# Altium schematic symbol library AD_Lib.SchLib: 1239 symbols (part 1 of 9) (continued)
## C1210_1uF/50V
designator C?, comment 1uF,50V
ÌùÆ¬µçÈÝ; Manufacturer: Murata; pro-environment: RoHS; Quality: -55~125¡æ; SN: 03.4.37.18.19010501S; other: 1uF,50V,10%; OPN: GCM32ER71H105KA37L; PadsNum: 2; Category: µçÈÝ; Part: GCM32ER71H105KA37L; Value: 1uF,50V; QTY: 1000; Price: 2.6091; OPN_JLC: OPN_JLC; SN_JLC: SN_JLC; Price_JLC: 0
footprint C1210 (Chip Capacitor; Body 1.2x 1.0 mm (LxW typ))
pins: 1, 2

## C1210_2.2nF/2kV@3
designator C?, comment 2.2nF,2kV
ÌùÆ¬µçÈÝ; Manufacturer: Yageo; pro-environment: RoHS; Quality: -55~125¡æ; other: 2.2nF,2kV,10%; OPN: CC1210KKX7RDBB222; PadsNum: 2; SN: SN; Category: µçÈÝ; Part: CC1210KKX7RDBB222; Value: 2.2nF,2kV; QTY: 2000; Price: 2.0592; OPN_JLC: OPN_JLC; SN_JLC: SN_JLC; Price_JLC: 0
footprint C1210 (Chip Capacitor; Body 1.2x 1.0 mm (LxW typ))
pins: 1, 2

## C1210_2.2uF/100V
designator C?, comment 2.2uF,100V
ÌùÆ¬µçÈÝ; Manufacturer: Murata; pro-environment: RoHS; Quality: -55~125¡æ; other: 2.2uF,100V,10%; OPN: GCM32DR72A225KA64L; PadsNum: 2; SN: SN; Category: µçÈÝ; Part: GCM32DR72A225KA64L; Value: 2.2uF,100V; QTY: 1000; Price: 2.5155; OPN_JLC: OPN_JLC; SN_JLC: SN_JLC; Price_JLC: 0
footprint C1210 (Chip Capacitor; Body 1.2x 1.0 mm (LxW typ))
pins: 1, 2

## C1210_4.7uF/50V
designator C?, comment 4.7uF,50V
ÌùÆ¬µçÈÝ; Manufacturer: Murata; pro-environment: RoHS; Quality: -55~125¡æ; SN: 03.4.37.18.19047501S; other: 4.7uF,50V,10%; OPN: GRM32ER71H475KA88L; PadsNum: 2; Category: µçÈÝ; Part: GRM32ER71H475KA88L; Value: 4.7uF,50V; QTY: 1000; Price: 2.0592; OPN_JLC: OPN_JLC; SN_JLC: SN_JLC; Price_JLC: 0
footprint C1210 (Chip Capacitor; Body 1.2x 1.0 mm (LxW typ))
pins: 1, 2

## C1210_10uF/50V
designator C?, comment 10uF,50V
ÌùÆ¬µçÈÝ; Manufacturer: Murata; pro-environment: RoHS; Quality: -55~125¡æ; SN: 03.4.37.18.19010605S; other: 10uF,50V,10%; OPN: GRM32ER71H106KA12L; PadsNum: 2; Category: µçÈÝ; Part: GRM32ER71H106KA12L; Value: 10uF,50V; QTY: 1000; Price: 2.1645; OPN_JLC: OPN_JLC; SN_JLC: SN_JLC; Price_JLC: 0
footprint C1210 (Chip Capacitor; Body 1.2x 1.0 mm (LxW typ))
pins: 1, 2

## C1210_10uF/50V@3
designator C?, comment 10uF,50V
ÌùÆ¬µçÈÝ; Manufacturer: Yageo; pro-environment: RoHS; Quality: -55~85¡æ; SN: 03.4.37.18.19010603S; other: 10uF,50V,20%; OPN: CC1210MKX5R9BB106; PadsNum: 2; Category: µçÈÝ; Part: CC1210MKX5R9BB106; Value: 10uF,50V; QTY: 500; Price: ?; OPN_JLC: OPN_JLC; SN_JLC: SN_JLC; Price_JLC: 0
footprint C1210 (Chip Capacitor; Body 1.2x 1.0 mm (LxW typ))
pins: 1, 2

## C1210_22uF/16V@2
designator C?, comment 22uF,16V
ÌùÆ¬µçÈÝ; Manufacturer: Panasonic; pro-environment: RoHS; Quality: -55~125¡æ; other: 22uF,16V,10%; OPN: Undefined; PadsNum: 2; SN: SN; Category: µçÈÝ; Value: 22uF,16V; Price: ?; OPN_JLC: OPN_JLC; SN_JLC: SN_JLC; Price_JLC: 0
footprint C1210 (Chip Capacitor; Body 1.2x 1.0 mm (LxW typ))
pins: 1, 2

## C1210_22uF/16V@3
designator C?, comment 22uF,25V
ÌùÆ¬µçÈÝ; Manufacturer: Yageo; pro-environment: RoHS; Quality: -55~85¡æ; SN: 03.4.37.18.19022601S; other: 22uF,25V,20%; OPN: CC1210MKX5R8BB226; PadsNum: 2; Category: µçÈÝ; Part: CC1210MKX5R8BB226; Value: 22uF,25V; Price: ?; OPN_JLC: OPN_JLC; SN_JLC: SN_JLC; Price_JLC: 0
footprint C1210 (Chip Capacitor; Body 1.2x 1.0 mm (LxW typ))
pins: 1, 2

## C1210_22uF/25V
designator C?, comment 22uF,25V
ÌùÆ¬µçÈÝ; Manufacturer: Murata; pro-environment: RoHS; Quality: -55~125¡æ; SN: 03.4.37.18.19022603S; other: 22uF,25V,10%; OPN: GRM32ER71E226KE15L; PadsNum: 2; Category: µçÈÝ; Part: GRM32ER71E226KE15L; Value: 22uF,25V; QTY: 1000; Price: 1.7901; OPN_JLC: OPN_JLC; SN_JLC: SN_JLC; Price_JLC: 0
footprint C1210 (Chip Capacitor; Body 1.2x 1.0 mm (LxW typ))
pins: 1, 2

## C1210_47nF/630V
designator C?, comment 47nF,630V
ÌùÆ¬µçÈÝ; Manufacturer: Murata; pro-environment: RoHS; Quality: -55~125¡æ; SN: 03.4.37.18.19047301S; other: 47nF,630V,10%; OPN: GRM32DR72J473KW01L; PadsNum: 2; Category: µçÈÝ; Part: GRM32DR72J473KW01L; Value: 47nF,630V; QTY: 1000; Price: 1.638; OPN_JLC: OPN_JLC; SN_JLC: SN_JLC; Price_JLC: 0
footprint C1210 (Chip Capacitor; Body 1.2x 1.0 mm (LxW typ))
pins: 1, 2

## C1210_47uF/16V
designator C?, comment 47uF,16V
MLCC C1210; Manufacturer: Yageo; pro-environment: RoHS; Quality: -55~85¡æ; other: 47uF,16V,20%; PadsNum: 2; Category: µçÈÝ; Value: 47uF,16V; Price: ?; OPN_JLC: OPN_JLC; SN_JLC: SN_JLC; Price_JLC: 0
footprint C1210 (Chip Capacitor; Body 1.2x 1.0 mm (LxW typ))
pins: 1, 2

## C1210_100uF/10V
designator C?, comment 100uF,10V
ÌùÆ¬µçÈÝ; Manufacturer: Murata; pro-environment: RoHS; Quality: -55~85¡æ; SN: 03.4.37.18.19010701S; other: 100uF,10V,20%; OPN: GRM32ER61A107ME20L; PadsNum: 2; Category: µçÈÝ; Part: GRM32ER61A107ME20L; Value: 100uF,10V; Price: ?; OPN_JLC: OPN_JLC; SN_JLC: SN_JLC; Price_JLC: 0
footprint C1210 (Chip Capacitor; Body 1.2x 1.0 mm (LxW typ))
pins: 1, 2

## C1210_100uF/16V@2
designator C?, comment 100uF,10V
ÌùÆ¬µçÈÝ; Manufacturer: Panasonic; pro-environment: RoHS; Quality: -55~125¡æ; other: 100uF,10V,20%; OPN: Undefined; PadsNum: 2; SN: SN; Category: µçÈÝ; Value: 100uF,10V; Price: ?; OPN_JLC: OPN_JLC; SN_JLC: SN_JLC; Price_JLC: 0
footprint C1210 (Chip Capacitor; Body 1.2x 1.0 mm (LxW typ))
pins: 1, 2

## C1812_0.1uF/630V
designator C?, comment 0.1uF,630V
ÌùÆ¬µçÈÝ; Manufacturer: Murata; pro-environment: RoHS; Quality: -55~125¡æ; SN: 03.4.37.18.20010401S; other: 0.1uF,630V,10%,X7R; OPN: GRM43DR72J104KW01L; PadsNum: 2; Category: µçÈÝ; Part: GRM43DR72J104KW01L; Value: 0.1uF,630V; QTY: 1000; Price: 1.5678; OPN_JLC: OPN_JLC; SN_JLC: SN_JLC; Price_JLC: 0
footprint C1812 (¹«ÖÆ4832£»Ó¢ÖÆ1812£»)
pins: 1, 2

## C1812_1nF/2kV
designator C?, comment 1nF,2kV
ÌùÆ¬µçÈÝ; Manufacturer: Murata; pro-environment: RoHS; Quality: -55~125¡æ; SN: 03.4.37.18.20010203S; other: 1nF,2kV,10%; OPN: GR443QR73D102KW01K; PadsNum: 2; Category: µçÈÝ; Part: GR443QR73D102KW01K; Value: 1nF,2kV; QTY: 4000; Price: 1.2519; OPN_JLC: OPN_JLC; SN_JLC: SN_JLC; Price_JLC: 0
footprint C1812 (¹«ÖÆ4832£»Ó¢ÖÆ1812£»)
pins: 1, 2

## C1812_1nF/2kV@3
designator C?, comment 1nF,250kV
ÌùÆ¬µçÈÝ; Manufacturer: Yageo; pro-environment: RoHS; Quality: -55~125¡æ; SN: 03.4.37.18.20010202S; other: 1nF,250V,10%; OPN: SC1812KKX7RWBB102; PadsNum: 2; Category: µçÈÝ; Part: SC1812KKX7RWBB102; Value: 1nF,250kV; QTY: 1000; Price: 2.0358; OPN_JLC: OPN_JLC; SN_JLC: SN_JLC; Price_JLC: 0
footprint C1812 (Footprint not found)
pins: 1, 2

## C1812_1nF/250V@3
designator C?, comment 1nF,250V
ÌùÆ¬µçÈÝ; Manufacturer: Yageo; pro-environment: RoHS; Quality: -55~125¡æ; SN: 03.4.37.18.20010202S; other: 1nF,250V,10%; OPN: SC1812KKX7RWBB102; PadsNum: 2; Category: µçÈÝ; Part: SC1812KKX7RWBB102; Value: 1nF,250V; QTY: 1000; Price: ?; OPN_JLC: OPN_JLC; SN_JLC: SN_JLC; Price_JLC: 0
footprint C1812 (¹«ÖÆ4832£»Ó¢ÖÆ1812£»)
pins: 1, 2

## C2220_2.2uF/250V
designator C?, comment 2.2uF,250V
ÌùÆ¬µçÈÝ; Manufacturer: TDK; pro-environment: RoHS; Quality: -55~125¡æ; other: 2.2uF,250V,20%; OPN: C5750X7T2E225M250KE; PadsNum: 2; SN: SN; Category: µçÈÝ; Part: C5750X7T2E225M250KE; Value: 2.2uF,250V; QTY: 500; Price: 13.0338; OPN_JLC: OPN_JLC; SN_JLC: SN_JLC; Price_JLC: 0
footprint C2220 (Footprint not found)
pins: 1, 2

## C2220_10uF/100V
designator C?, comment 10uF,100V
ÌùÆ¬µçÈÝ; Manufacturer: TDK; pro-environment: RoHS; Quality: -55~125¡æ; other: 10uF,100V,20%; OPN: CGA9N3X7S2A106M230KB; PadsNum: 2; SN: SN; Category: µçÈÝ; Part: CGA9N3X7S2A106M230KB; Value: 10uF,100V; QTY: 500; Price: 8.4825; OPN_JLC: OPN_JLC; SN_JLC: SN_JLC; Price_JLC: 0
footprint C2220 (Footprint not found)
pins: 1, 2

## C_0.1uF/50V
designator C?, comment 0.1uF,50V
ÌùÆ¬PPSµçÈÝ; Manufacturer: Murata; pro-environment: RoHS; Quality: -55~125¡æ; SN: 03.4.37.12.99010401S; other: 0.1uF,50V,10%; OPN: ECHU1H104Gx9; PadsNum: 2; Category: µçÈÝ; Part: ECHU1H104Gx9; Value: 0.1uF,50V; QTY: 3000; Price: ?; OPN_JLC: OPN_JLC; SN_JLC: SN_JLC; Price_JLC: 0
footprint CC4532-1812-
pins: 1, 2

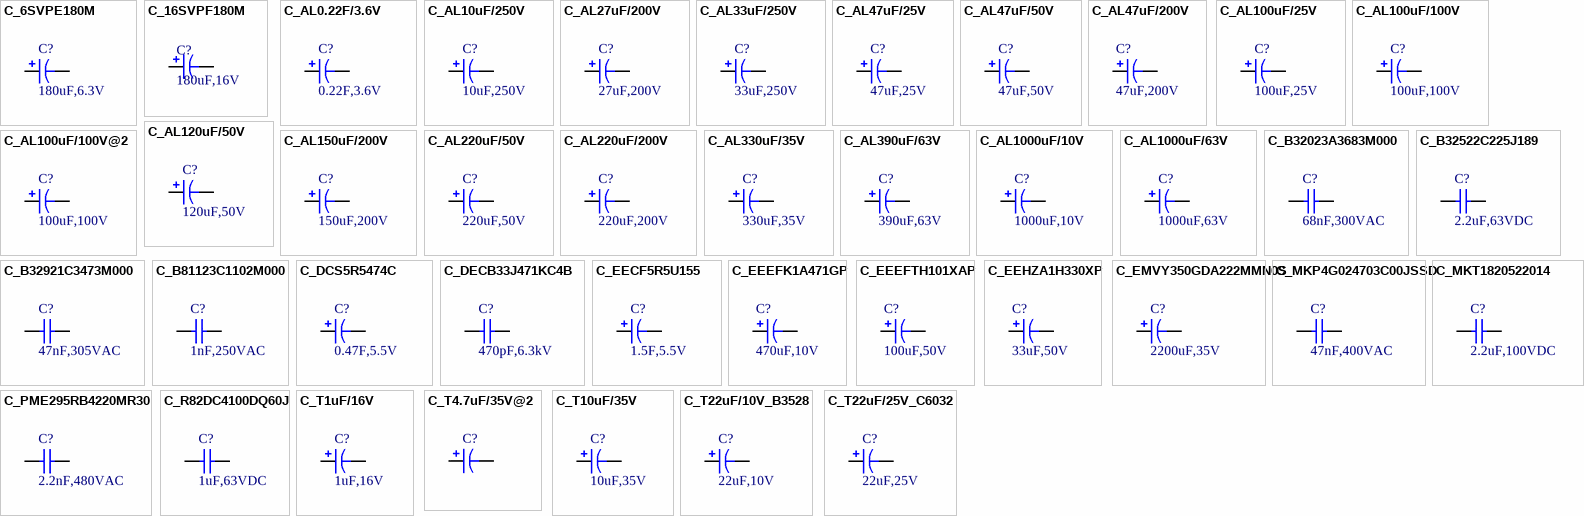
[diagram p3: symbols C_6SVPE180M to C_T22uF/25V_C6032]

## C_6SVPE180M
designator C?, comment 180uF,6.3V
¹ÌÌ¬µçÈÝ; 180uF/6.3V; 20%; Manufacturer: Panasonic; pro-environment: RoHS; Quality: -55~105¡ãC; other: 180uF,6.3V,20%; OPN: 6SVPE180M; PadsNum: 2; SN: SN; Category: µçÈÝ; Part: 6SVPE180M; Value: 180uF,6.3V; QTY: 1500; Price: 3.4515; OPN_JLC: OPN_JLC; SN_JLC: C178382; Price_JLC: 2.66
footprint C_SMD5x5.9 (PanasonicÖ®ÂÁÓÐ»ú¾ÛºÏÎïµçÈÝÆ÷)
pins: 1, 2

## C_16SVPF180M
designator C?, comment 180uF,16V
¹ÌÌ¬µçÈÝ; 180uF/16V; 20%; Manufacturer: Panasonic; OPN: 16SVPF180M; other: 180uF,16V,20%; pro-environment: RoHS; Quality: -55~105¡ãC; PadsNum: 2; Category: µçÈÝ; Part: 16SVPF180M; Price: 3.3228; QTY: 1000; SN: SN; Value: 180uF,16V; OPN_JLC: 16SVPF180M; SN_JLC: C136277; Price_JLC: 2.95
footprint C_SMD6.3x5.9 (PanasonicÖ®SVPEÏµÁÐ¹ÌÌ¬µçÈÝ)
pins: 1, 2

## C_AL0.22F/3.6V
designator C?, comment 0.22F,3.6V
ÂÁµç½âµçÈÝ; 10¡Á11.5¡Á6; Manufacturer: Panasonic; pro-environment: RoHS; Quality: -55~125¡æ; other: 0.22F,3.6V,20%,1000h,25mm; OPN: EEC-RG0V224H; PadsNum: 2; SN: SN; Category: µçÈÝ; Part: EEC-RG0V224H; Value: 0.22F,3.6V; QTY: 50; Price: 8.42; OPN_JLC: EECRG0V224H; SN_JLC: C236295; Price_JLC: 8.42
footprint C_EECRG0V224 (Footprint not found)
pins: 1, 2

## C_AL10uF/250V
designator C?, comment 10uF,250V
ÂÁµç½âµçÈÝ;5x10; Manufacturer: Nichicon; pro-environment: RoHS; Quality: -55~125¡æ; SN: 03.4.37.12.99010002S; other: 10uF,250V,20%,8000h,20mm; OPN: UCS2E100MPD; PadsNum: 2; Category: µçÈÝ; Part: UCS2E100MPD; Value: 10uF,250V; QTY: 200; Price: 2.2698; OPN_JLC: OPN_JLC; SN_JLC: SN_JLC; Price_JLC: 0
footprint C_RD5x10 (Ö±²åµç½âµçÈÝ)
pins: 1, 2

## C_AL27uF/200V
designator C?, comment 27uF,200V
ÂÁµç½âµçÈÝ;5x10; Manufacturer: Nichicon; pro-environment: RoHS; Quality: -55~125¡æ; SN: 03.4.37.12.99027001S; other: 150uF,200V,20%,1000h; OPN: ULD2D270MPD1TD; PadsNum: 2; Category: µçÈÝ; Part: ULD2D270MPD1TD; Value: 27uF,200V; QTY: 500; Price: 3.4398; OPN_JLC: OPN_JLC; SN_JLC: SN_JLC; Price_JLC: 0
footprint C_RD5x10 (Ö±²åµç½âµçÈÝ)
pins: 1, 2

## C_AL33uF/250V
designator C?, comment 33uF,250V
ÂÁµç½âµçÈÝ;5x12.5; Manufacturer: Nichicon; pro-environment: RoHS; Quality: -55~125¡æ; SN: 03.4.37.12.99033002S; other: 33uF,250V,20%,8000h,20mm; OPN: UCS2E330MHD1TO; PadsNum: 2; Category: µçÈÝ; Part: UCS2E330MHD1TO; Value: 33uF,250V; QTY: 500; Price: 2.691; OPN_JLC: OPN_JLC; SN_JLC: SN_JLC; Price_JLC: 0
footprint C_RD5x12.5 (Footprint not found)
pins: 1, 2

## C_AL47uF/25V
designator C?, comment 47uF,25V
ÂÁµç½âµçÈÝ;2x5; Manufacturer: Nichicon; pro-environment: RoHS; Quality: -55~105¡æ; other: 47uF,25V,20%,2000h; OPN: UPW1E470MDD; PadsNum: 2; SN: SN; Category: µçÈÝ; Part: UPW1E470MDD; Value: 47uF,25V; QTY: 200; Price: 0.55809; OPN_JLC: OPN_JLC; SN_JLC: SN_JLC; Price_JLC: 0
footprint C_RD2x5 (Ö±²åµç½âµçÈÝ)
pins: 1, 2

## C_AL47uF/50V
designator C?, comment 47uF,50V
ÂÁµç½âµçÈÝ;3.5x6.3; Manufacturer: Nichicon; pro-environment: RoHS; Quality: -55~105¡æ; SN: 03.4.37.12.99047001S; other: 47uF,50V,20%,5000h; OPN: UPV1H470MGD; PadsNum: 2; Category: µçÈÝ; Part: UPV1H470MGD; Value: 47uF,50V; QTY: 200; Price: 1.7199; OPN_JLC: OPN_JLC; SN_JLC: SN_JLC; Price_JLC: 0
footprint C_RD3.5x6.3 (Ö±²åµç½âµçÈÝ)
pins: 1, 2

## C_AL47uF/200V
designator C?, comment 47uF,200V
ÂÁµç½âµçÈÝ;5x12.5; Manufacturer: Nichicon; Quality: -40~105¡ãC; SN: 03.4.37.12.99047002S; other: 47uF,200V,20%; OPN: UPW2D470MHD; PadsNum: 2; Category: µçÈÝ; Part: UPW2D470MHD; Value: 47uF,200V; QTY: 1000; Price: ?; OPN_JLC: OPN_JLC; SN_JLC: SN_JLC; Price_JLC: 0
footprint C_RD5x12.5 (Ö±²åµç½âµçÈÝ)
pins: 1, 2

## C_AL100uF/25V
designator C?, comment 100uF,25V
ÂÁµç½âµçÈÝ; 2.5¡Á6.3¡Á11.0; Manufacturer: Nichicon; pro-environment: RoHS; Quality: -40~105¡æ; SN: 03.4.37.12.99010105S; other: 100uF,25V,20%,340mA,5000h; OPN: UHE1E101MED; PadsNum: 2; Category: µçÈÝ; Part: UHE1E101MED; Value: 100uF,25V; QTY: 200; Price: 0.74295; OPN_JLC: OPN_JLC; SN_JLC: SN_JLC; Price_JLC: 0
footprint C_RD2.5x6.3 (Footprint not found)
pins: 1, 2

## C_AL100uF/100V
designator C?, comment 100uF,100V
ÂÁµç½âµçÈÝ; 5.0¡Á10.0¡Á25.0; Manufacturer: Nichicon; pro-environment: RoHS; Quality: -40~105¡æ; SN: 03.4.37.12.99010106S; other: 100uF,100V,20%,595mA,7000h; OPN: UHE2A101MPD; PadsNum: 2; Category: µçÈÝ; Part: UHE2A101MPD; Value: 100uF,100V; QTY: 200; Price: 1.8486; OPN_JLC: OPN_JLC; SN_JLC: SN_JLC; Price_JLC: 0
footprint C_RD5x10 (Ö±²åµç½âµçÈÝ)
pins: 1, 2

## C_AL100uF/100V@2
designator C?, comment 100uF,100V
ÂÁµç½âµçÈÝ; 5.0¡Á12.5¡Á20.0; Manufacturer: Nichicon; pro-environment: RoHS; Quality: -40~105¡æ; SN: 03.4.37.12.99010107S; other: 100uF,100V,20%,595mA,7000h; OPN: UPW2A101MHD; PadsNum: 2; Category: µçÈÝ; Part: UPW2A101MHD; Value: 100uF,100V; QTY: 100; Price: 2.925; OPN_JLC: OPN_JLC; SN_JLC: SN_JLC; Price_JLC: 0
footprint C_RD5x12.5 (Ö±²åµç½âµçÈÝ)
pins: 1, 2

## C_AL120uF/50V
designator C?, comment 120uF,50V
ÂÁµç½âµçÈÝ;5x10; Manufacturer: Nichicon; pro-environment: RoHS; Quality: -55~105¡æ; SN: 03.4.37.12.99012101S; other: 120uF,50V,20%,8000h; OPN: UPW1H121MPD6; PadsNum: 2; Category: µçÈÝ; Part: UPW1H121MPD6; Value: 120uF,50V; QTY: 200; Price: -; OPN_JLC: OPN_JLC; SN_JLC: SN_JLC; Price_JLC: 0
footprint C_RD5x10 (Ö±²åµç½âµçÈÝ)
pins: 1, 2

## C_AL150uF/200V
designator C?, comment 150uF,200V
ÂÁµç½âµçÈÝ; 7.5x18; Manufacturer: Nichicon; pro-environment: RoHS; Quality: -55~125¡æ; SN: 03.4.37.12.99015101S; other: 150uF,200V,20%,1000h; OPN: URZ2D151MHD; PadsNum: 2; Category: µçÈÝ; Part: URZ2D151MHD; Value: 150uF,200V; QTY: 50; Price: 16.0173; OPN_JLC: OPN_JLC; SN_JLC: SN_JLC; Price_JLC: 0
footprint C_RD7.5x18 (Ö±²åµç½âµçÈÝ)
pins: 1, 2

## C_AL220uF/50V
designator C?, comment 220uF,50V
ÂÁµç½âµçÈÝ;5x10x13; Manufacturer: AISHI; pro-environment: RoHS; Quality: -40~105¡æ; other: 220uF,50V,20%,2000h; OPN: EWH1HM221G13OT; PadsNum: 0; SN: SN; Category: µçÈÝ; Part: EWH1HM221G13OT; Value: 220uF,50V; QTY: 250; Price: -; OPN_JLC: EWH1HM221G13OT; SN_JLC: C105324; Price_JLC: 0.398604
footprint C_RD5x10 (Ö±²åµç½âµçÈÝ)
pins: 1, 2

## C_AL220uF/200V
designator C?, comment 220uF,200V
ÂÁµç½âµçÈÝ; 7.5x18; Manufacturer: Nichicon; pro-environment: RoHS; Quality: -55~125¡æ; SN: 03.4.37.12.99022102S; other: 220uF,200V,20%,8000h; OPN: UCS2D221MHD1TN; PadsNum: 2; Category: µçÈÝ; Part: UCS2D221MHD1TN; Value: 220uF,200V; QTY: 50; Price: -; OPN_JLC: OPN_JLC; SN_JLC: SN_JLC; Price_JLC: 0
footprint C_RD7.5x18 (Ö±²åµç½âµçÈÝ)
pins: 1, 2

## C_AL330uF/35V
designator C?, comment 330uF,35V
ÂÁµç½âµçÈÝ;5x10; Manufacturer: Nichicon; pro-environment: RoHS; Quality: -55~105¡æ; SN: 03.4.37.12.99033101S; other: 330uF,35V,20%,5000h,1060mA; OPN: UPM1V331MPD; PadsNum: 2; Category: µçÈÝ; Part: UPM1V331MPD; Value: 330uF,35V; QTY: 200; Price: 1.8837; OPN_JLC: OPN_JLC; SN_JLC: SN_JLC; Price_JLC: 0
footprint C_RD5x10 (Ö±²åµç½âµçÈÝ)
pins: 1, 2

## C_AL390uF/63V
designator C?, comment 390uF,63V
ÂÁµç½âµçÈÝ; 5x10x12.5; Manufacturer: Nichicon; pro-environment: RoHS; Quality: -55~105¡æ; SN: 03.4.37.12.99039101S; other: 390uF,63V,20%,5000h,1720mA; OPN: UPW1J391MHD; PadsNum: 2; Category: µçÈÝ; Part: UPW1J391MHD; Value: 390uF,63V; QTY: 100; Price: 3.5685; OPN_JLC: OPN_JLC; SN_JLC: SN_JLC; Price_JLC: 0
footprint C_RD5x12.5 (Ö±²åµç½âµçÈÝ)
pins: 1, 2

## C_AL1000uF/10V
designator C?, comment 1000uF,10V
ÂÁµç½âµçÈÝ; 5x10; Manufacturer: Nichicon; pro-environment: RoHS; Quality: -55~125¡æ; SN: 03.4.37.12.99010202S; other: 1000uF,10V,20%,5000h,20mm; OPN: UPM1A102MPD; PadsNum: 2; Category: µçÈÝ; Part: UPM1A102MPD; Value: 1000uF,10V; QTY: 200; Price: 1.872; OPN_JLC: OPN_JLC; SN_JLC: SN_JLC; Price_JLC: 0
footprint C_RD5x10 (Ö±²åµç½âµçÈÝ)
pins: 1, 2

## C_AL1000uF/63V
designator C?, comment 1000uF,63V
ÂÁµç½âµçÈÝ; 7.5¡Á16¡Á25.0; Manufacturer: Nichicon; pro-environment: RoHS; Quality: -55~125¡æ; SN: 03.4.37.12.99010201S; other: 1000uF,63V,20%,1000h,25mm; OPN: UVZ1J102MHD; PadsNum: 2; Category: µçÈÝ; Part: UVZ1J102MHD; Value: 1000uF,63V; QTY: 50; Price: 6.4701; OPN_JLC: OPN_JLC; SN_JLC: SN_JLC; Price_JLC: 0
footprint C_RD7.5x16 (Ö±²åµç½âµçÈÝ)
pins: 1, 2

## C_B32023A3683M000
designator C?, comment 68nF,300VAC
X1Y2µçÈÝ,68nF/300VAC; Manufacturer: TDK; Part: B32023A3683M; pro-environment: RoHS; Quality: -40~110¡æ; SN: 03.4.37.17.99110201S; other: 68nF,300VAC,20%; OPN: B32023A3683M000; PadsNum: 2; Category: µçÈÝ; Value: 68nF,300VAC; QTY: 1000; Price: 1.6731; OPN_JLC: OPN_JLC; SN_JLC: SN_JLC; Price_JLC: 0
footprint B32023_7¡Á16¡Á26.5 (TDKÖ®X2µçÈÝ£¬Òý½Å¼ä¾à=22.5mm£¬³ß´ç = w ¡Á h ¡Á l)
pins: 1, 2

## C_B32522C225J189
designator C?, comment 2.2uF,63VDC
±¡Ä¤µçÈÝ,2.2uF/63VDC; Manufacturer: TDK; pro-environment: RoHS; Quality: -40~110¡æ; SN: 03.4.37.24.99022502S; other: 2.2uF,63VDC,5%; OPN: B32522C0225J189; PadsNum: 2; Category: µçÈÝ; Part: B32522C0225J189; Value: 2.2uF,63VDC; QTY: 5200; Price: 5.6628; OPN_JLC: OPN_JLC; SN_JLC: SN_JLC; Price_JLC: 0
footprint B32522_5¡Á10.5¡Á18 (Footprint not found)
pins: 1, 2

## C_B32921C3473M000
designator C?, comment 47nF,305VAC
X2µçÈÝ,47nF/305VAC; Manufacturer: TDK; pro-environment: RoHS; Quality: -40~110¡æ; SN: 03.4.37.17.99347301S; other: 47nF,305VAC,20%; OPN: B32921C3473M000; PadsNum: 2; Category: µçÈÝ; Part: B32921C3473M000; Value: 47nF,305VAC; QTY: 1000; Price: 1.06236; OPN_JLC: OPN_JLC; SN_JLC: SN_JLC; Price_JLC: 0
footprint B32921_5¡Á11¡Á13 (TDKÖ®X2µçÈÝ£¬Òý½Å¼ä¾à = 10mm£¬³ß´ç = w ¡Á h ¡Á l)
pins: 1, 2

## C_B81123C1102M000
designator C?, comment 1nF,250VAC
Y1µçÈÝ,1nF/250VAC; Manufacturer: TDK; pro-environment: RoHS; Quality: -40~110¡æ; SN: 03.4.37.17.99110201S; other: 1nF,500VAC,20%; OPN: B81123C1102M000; PadsNum: 2; Category: µçÈÝ; Part: B81123C1102M000; Value: 1nF,250VAC; QTY: 1000; Price: 1.6731; OPN_JLC: OPN_JLC; SN_JLC: SN_JLC; Price_JLC: 0
footprint B81123_5¡Á10.5¡Á18 (TDKÖ®Y1µçÈÝ£¬Òý½Å¼ä¾à = 15mm£¬³ß´ç = w ¡Á h ¡Á l)
pins: 1, 2

## C_DCS5R5474C
designator C?, comment 0.47F,5.5V
³¬¼¶µçÈÝ; 0.47F; 5.5V; 20%; Manufacturer: Korchip; pro-environment: RoHS; Quality: -25~70¡æ; other: 0.47F,5.5V,20%;1000h(70¡æ); OPN: DCS5R5474C; PadsNum: 2; SN: SN; Category: µçÈÝ; Part: DCS5R5474C; Value: 0.47F,5.5V; QTY: 500; Price: 5.44; OPN_JLC: DCS5R5474C; SN_JLC: C260760; Price_JLC: 5.44
footprint C_RD5x13.5x7 (Footprint not found)
pins: 1, 2

## C_DECB33J471KC4B
designator C?, comment 470pF,6.3kV
´ÉÆ¬µçÈÝ,470pF/6.3kVDC; Manufacturer: Murata; pro-environment: RoHS; Quality: -25~85¡æ; other: 470pF,6.3VDC,10%; OPN: DECB33J471KC4B; PadsNum: 2; SN: SN; Category: µçÈÝ; Part: DECB33J471KC4B; Value: 470pF,6.3kV; QTY: 100; Price: 2.2347; OPN_JLC: OPN_JLC; SN_JLC: SN_JLC; Price_JLC: 0
footprint DEC-C4_10¡Á10¡Á7 (MurutaÖ®DEÏµÁÐ¸ßÑ¹´ÉÆ¬µçÈÝ£¬Òý½Å¼ä¾à=10mm£¬³ß´ç = D ¡Á F ¡Á T)
pins: 1, 2

## C_EECF5R5U155
designator C?, comment 1.5F,5.5V
³¬¼¶µçÈÝ;1.5F;5.5V; Manufacturer: Nichicon; pro-environment: RoHS; Quality: -25~70¡æ; other: 1.5F,5.5V,20%;1000h(70¡æ); OPN: EECF5R5U155; PadsNum: 2; SN: SN; Category: µçÈÝ; Part: EECF5R5U155; Value: 1.5F,5.5V; QTY: 200; Price: 18.2637; OPN_JLC: OPN_JLC; SN_JLC: SN_JLC; Price_JLC: 0
footprint C_RD5x21.5 (ËÉÏÂNFÏµÁÐ³¬¼¶µçÈÝ£¬EECF5R5U155)
pins: 1, 2

## C_EEEFK1A471GP
designator C?, comment 470uF,10V
¹ÌÌ¬µçÈÝ; 470uF/10V; 20%; Manufacturer: Panasonic; pro-environment: RoHS; Quality: -55~105¡æ; other: 470uF,10V,20%; OPN: EEEFK1A471GP; PadsNum: 2; SN: SN; Category: µçÈÝ; Part: EEEFK1A471GP; Value: 470uF,10V; QTY: 500; Price: ?; OPN_JLC: EEEFK1A471GP; SN_JLC: C401652; Price_JLC: 2.48
footprint C_SMD8x10.2 (PanasonicÖ®FVÏµÁÐKÐÍ)
pins: 1, 2

## C_EEEFTH101XAP
designator C?, comment 100uF,50V
100uF/50V; 20%; Manufacturer: Panasonic; pro-environment: RoHS; Quality: -55~105°C; other: 100uF,50V,20%; OPN: EEE-FTH101XAP; PadsNum: 2; SN: SN; Category: Electrolytic Capacitors; Part: EEE-FTH101XAP; Value: 100uF,50V; QTY: 500; Price: ?; OPN_JLC: EEE-FTH101XAP; SN_JLC: C401652; Price_JLC: 2.48
footprint C_SMD6.3x7.7 (Panasonic,  Series : ZA  Type : V)
pins: 1, 2

## C_EEHZA1H330XP
designator C?, comment 33uF,50V
¹ÌÌ¬µçÈÝ; 33uF/50V; 20%; Manufacturer: Panasonic; pro-environment: RoHS; Quality: -55~105¡æ; other: 33uF,50V,20%; OPN: EEHZA1H330XP; PadsNum: 2; SN: SN; Category: µçÈÝ; Part: EEHZA1H330XP; Value: 33uF,50V; QTY: 900; Price: ?; OPN_JLC: OPN_JLC; SN_JLC: C178637; Price_JLC: 1.98
footprint C_SMD6.3x7.7 (Panasonic,  Series : ZA  Type : V)
pins: 1, 2

## C_EMVY350GDA222MMN0S
designator C?, comment 2200uF,35V
ÂÁ¾ÛºÏÎïµçÈÝ,2200uF/35V; Manufacturer: United Chemi-Con (UCC); pro-environment: RoHS; Quality: -55~105¡ãC; SN: 03.4.37.12.99022201S; other: 2200uF,35V,20%; OPN: EMVY350GDA222MMN0S; PadsNum: 2; Category: µçÈÝ; Part: EMVY350GDA222MMN0S; Value: 2200uF,35V; QTY: 75; Price: ?; OPN_JLC: OPN_JLC; SN_JLC: SN_JLC; Price_JLC: 0
footprint C_AL-MN0 (ÂÁ¾ÛºÏÎïµçÈÝ£»MVYÏµÁÐ£¬MN0£»EMVY350GDA222MMN0S)
pins: 1, 2

## C_MKP4G024703C00JSSD
designator C?, comment 47nF,400VAC
X1Y2µçÈÝ,47nF/400VAC; Manufacturer: WIMA; pro-environment: RoHS; Quality: -55~100¡æ; other: 47nF,400VAC,5%; OPN: MKP4G024703C00JSSD; PadsNum: 2; SN: SN; Category: µçÈÝ; Part: MKP4G024703C00JSSD; Value: 47nF,400VAC; QTY: 2000; Price: 2.1645; OPN_JLC: OPN_JLC; SN_JLC: SN_JLC; Price_JLC: 0
footprint WIMA_5x11x13x10 (WIMAµçÈÝ£¬WxHxLxPCM)
pins: 1, 2

## C_MKT1820522014
designator C?, comment 2.2uF,100VDC
±¡Ä¤µçÈÝ,68nF/100VDC; Manufacturer: Vishay; pro-environment: RoHS; Quality: -55~100¡æ; SN: 03.4.37.24.99022001S; other: 2.2uF,100VDC,65VAC,5%; OPN: MKT1820522014; PadsNum: 2; Category: µçÈÝ; Part: MKT1820522014; Value: 2.2uF,100VDC; QTY: ?; Price: ?; OPN_JLC: OPN_JLC; SN_JLC: SN_JLC; Price_JLC: 0
footprint MKT1820_6.5¡Á12.5¡Á18 (VishayÖ®MKT1820ÏµÁÐµçÈÝ£¬Òý½Å¼ä¾à=215mm£¬³ß´ç = w ¡Á h ¡Á l)
pins: 1, 2

## C_PME295RB4220MR30
designator C?, comment 2.2nF,480VAC
Y1µçÈÝ,2.2nF/48VAC; Manufacturer: Kemet; pro-environment: RoHS; Quality: -40~115¡æ; other: 2200pF,480VAC,20%; OPN: PME295RB4220MR30; PadsNum: 2; SN: SN; Category: µçÈÝ; Part: PME295RB4220MR30; Value: 2.2nF,480VAC; QTY: 400; Price: 6.1308; OPN_JLC: OPN_JLC; SN_JLC: SN_JLC; Price_JLC: 0
footprint PME295_15x6.5 (KemetÖ®PME295ÏµÁÐY1µçÈÝ)
pins: 1, 2

## C_R82DC4100DQ60J
designator C?, comment 1uF,63VDC
±¡Ä¤µçÈÝ,1uF/63VDC; Manufacturer: KEMET; pro-environment: RoHS; Quality: -55~105¡æ; other: 1uF,63VDC,5%; OPN: R82DC4100DQ60J; PadsNum: 2; SN: SN; Category: µçÈÝ; Part: R82DC4100DQ60J; Value: 1uF,63VDC; QTY: 1700; Price: 0.97578; OPN_JLC: OPN_JLC; SN_JLC: SN_JLC; Price_JLC: 0
footprint R82DC_5¡Á10¡Á7.2 (KEMETÖ®R82ÏµÁÐµçÈÝ£¬Òý½Å¼ä¾à = 5mm£¬³ß´ç = w ¡Á h ¡Á l)
pins: 1, 2

## C_T1uF/16V
designator C?, comment 1uF,16V
îãµçÈÝ; Manufacturer: Kemet; pro-environment: RoHS; Quality: -55~125¡æ; SN: 03.4.37.11.99A10501S; other: 1uF,16V,10%; OPN: T491A105K016AT; PadsNum: 2; Category: µçÈÝ; Part: T491A105K016AT; Value: 1uF,16V; Price: ?; OPN_JLC: OPN_JLC; SN_JLC: SN_JLC; Price_JLC: 0
footprint C_T3216-18A (îãµçÈÝ£»KEMET-AÐÍ·â×°)
pins: 1, 2

## C_T4.7uF/35V@2
designator C?, comment 4.7uF,35V  (value not drawn)
îãµçÈÝ; Manufacturer: AVX; pro-environment: RoHS; Quality: -55~125¡æ; other: 4.7uF,35V,10%,1.5¦¸; OPN: TAJD 475K 035RWJ; PadsNum: 2; SN: SN; Category: µçÈÝ; Part: TAJD 475K 035RWJ; Value: 4.7uF,35V; Price: ?; OPN_JLC: OPN_JLC; SN_JLC: SN_JLC; Price_JLC: 0
footprint C_T7343-31D (îãµçÈÝ£»KEMET-DÐÍ)
pins: 1, 2

## C_T10uF/35V
designator C?, comment 10uF,35V
îãµçÈÝ; Manufacturer: Kemet; pro-environment: RoHS; Quality: -55~125¡æ; SN: 03.4.37.11.99D10602S; other: 10uF,35V,10%,2.4¦¸; OPN: T491D106K035AT; PadsNum: 2; Category: µçÈÝ; Part: T491D106K035AT; Value: 10uF,35V; QTY: 500; Price: 3.6036; OPN_JLC: OPN_JLC; SN_JLC: SN_JLC; Price_JLC: 0
footprint C_T7343-31D (îãµçÈÝ£»KEMET-DÐÍ)
pins: 1, 2

## C_T22uF/10V_B3528
designator C?, comment 22uF,10V
îãµçÈÝ; Manufacturer: Kemet; pro-environment: RoHS; Quality: -55~125¡æ; SN: 03.4.37.11.99B22601S; other: 22uF,10V,20%,2.4¦¸; OPN: T491B226M010AT; PadsNum: 2; Category: µçÈÝ; Part: T491B226M010AT; Value: 22uF,10V; QTY: 2000; Price: 1.2402; OPN_JLC: OPN_JLC; SN_JLC: C117031; Price_JLC: 0
footprint C_T3528-21B (îãµçÈÝ£»KEMET-BÐÍ)
pins: 1, 2

## C_T22uF/25V_C6032
designator C?, comment 22uF,25V
îãµçÈÝ; Manufacturer: AVX; pro-environment: RoHS; Quality: -55~125¡æ; other: 22uF,25V,20%,0.9¦¸; OPN: TAJC226K025RNJ; PadsNum: 2; SN: SN; Category: µçÈÝ; Part: TAJC226K025RNJ; Value: 22uF,25V; QTY: 500; Price: 2.825; OPN_JLC: TAJC226K025RNJ; SN_JLC: C7214; Price_JLC: 1.5
footprint C_T6032-28C (îãµçÈÝ£»KEMET-CÐÍ)
pins: 1, 2

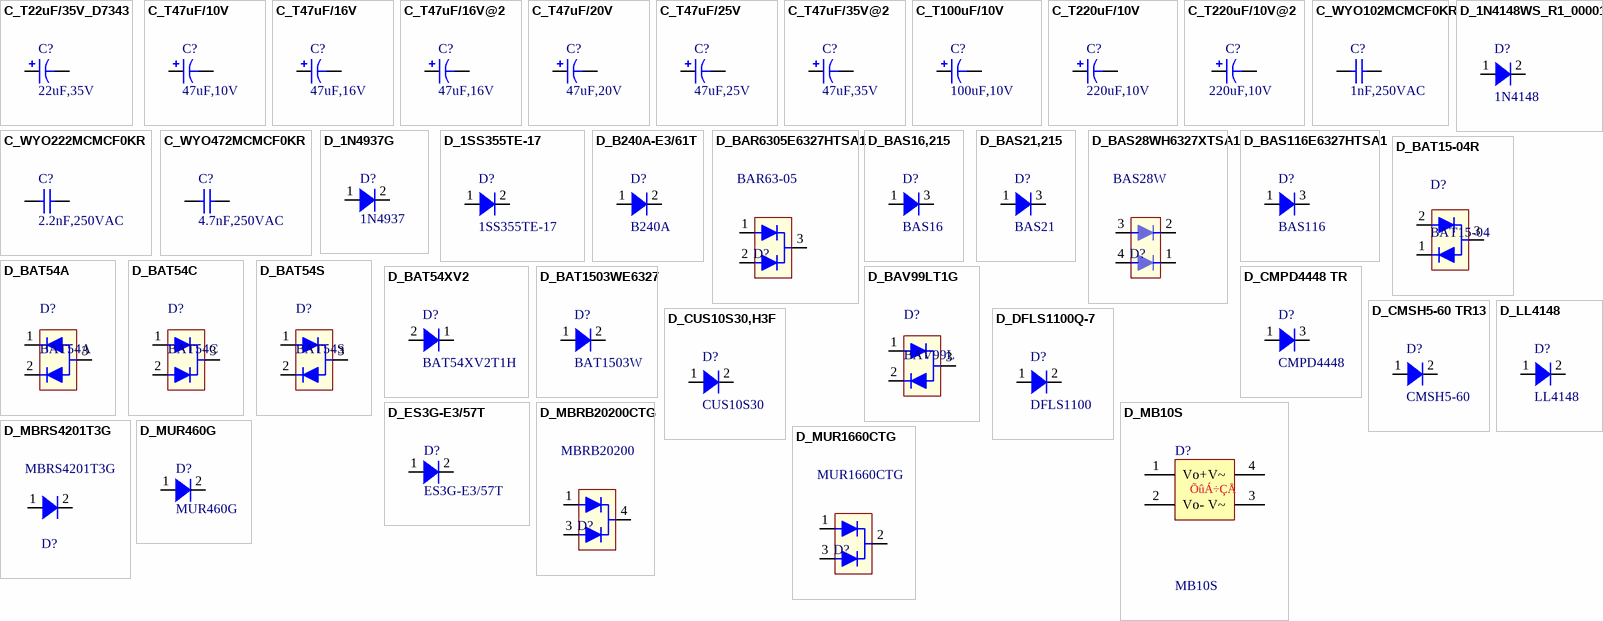
[diagram p4: symbols C_T22uF/35V_D7343 to D_MUR1660CTG]

## C_T22uF/35V_D7343
designator C?, comment 22uF,35V
îãµçÈÝ; Manufacturer: AVX; pro-environment: RoHS; Quality: -55~125¡æ; SN: 03.4.37.11.99D26601S; other: 22uF,35V,20%,0.9¦¸; OPN: TAJD226K035RNJ; PadsNum: 2; Category: µçÈÝ; Part: TAJD226K035RNJ; Value: 22uF,35V; QTY: 500; Price: 7.0785; OPN_JLC: OPN_JLC; SN_JLC: C7225; Price_JLC: 0
footprint C_T7343-31D (îãµçÈÝ£»KEMET-DÐÍ)
pins: 1, 2

## C_T47uF/10V
designator C?, comment 47uF,10V
îãµçÈÝ; Manufacturer: Kemet; pro-environment: RoHS; Quality: -55~125¡æ; SN: 03.4.37.11.99C47601S; other: 47uF,10V,10%; OPN: T491C476K010AT; PadsNum: 2; Category: µçÈÝ; Part: T491C476K010AT; Value: 47uF,10V; QTY: 500; Price: 2.3166; OPN_JLC: OPN_JLC; SN_JLC: SN_JLC; Price_JLC: 0
footprint C_T6032-28C (îãµçÈÝ£»KEMET-CÐÍ)
pins: 1, 2

## C_T47uF/16V
designator C?, comment 47uF,16V
îãµçÈÝ; Manufacturer: Kemet; pro-environment: RoHS; Quality: -55~125¡æ; other: 47uF,16V,10%; OPN: T491D476K016AT; PadsNum: 2; SN: SN; Category: µçÈÝ; Part: T491D476K016AT; Value: 47uF,16V; Price: ?; OPN_JLC: OPN_JLC; SN_JLC: SN_JLC; Price_JLC: 0
footprint C_T7343-31D (îãµçÈÝ£»KEMET-DÐÍ)
pins: 1, 2

## C_T47uF/16V@2
designator C?, comment 47uF,16V
îãµçÈÝ; Manufacturer: AVX; pro-environment: RoHS; Quality: -55~125¡æ; other: 47uF,16V,10%; OPN: TAJD476K016RNJ; PadsNum: 2; SN: SN; Category: µçÈÝ; Part: TAJD476K016RNJ; Value: 47uF,16V; Price: ?; OPN_JLC: OPN_JLC; SN_JLC: SN_JLC; Price_JLC: 0
footprint C_T7343-31D (îãµçÈÝ£»KEMET-DÐÍ)
pins: 1, 2

## C_T47uF/20V
designator C?, comment 47uF,20V
îãµçÈÝ; Manufacturer: Kemet; pro-environment: RoHS; Quality: -55~125¡æ; SN: 03.4.37.11.99D47603S; other: 47uF,20V,10%,0.7¦¸; OPN: T491D476K020AT; PadsNum: 2; Category: µçÈÝ; Part: T491D476K020AT; Value: 47uF,20V; QTY: 500; Price: 3.6504; OPN_JLC: OPN_JLC; SN_JLC: SN_JLC; Price_JLC: 0
footprint C_T7343-31D (îãµçÈÝ£»KEMET-DÐÍ)
pins: 1, 2

## C_T47uF/25V
designator C?, comment 47uF,25V
îãµçÈÝ; Manufacturer: Kemet; pro-environment: RoHS; Quality: -55~125¡æ; other: 47uF,25V,10%; OPN: T491D476K025AT; PadsNum: 2; SN: SN; Category: µçÈÝ; Part: T491D476K025AT; Value: 47uF,25V; Price: ?; OPN_JLC: OPN_JLC; SN_JLC: SN_JLC; Price_JLC: 0
footprint C_T7343-31D (îãµçÈÝ£»KEMET-DÐÍ)
pins: 1, 2

## C_T47uF/35V@2
designator C?, comment 47uF,35V
îãµçÈÝ; Manufacturer: AVX; pro-environment: RoHS; Quality: -55~125¡æ; other: 47uF,35V,0.9¦¸,10%; OPN: TAJE476K035RNJ; PadsNum: 2; SN: SN; Category: µçÈÝ; Part: TAJE476K035RNJ; Value: 47uF,35V; QTY: 400; Price: 24.3594; OPN_JLC: OPN_JLC; SN_JLC: SN_JLC; Price_JLC: 0
footprint C_T7343-31D (îãµçÈÝ£»KEMET-DÐÍ)
pins: 1, 2

## C_T100uF/10V
designator C?, comment 100uF,10V
îãµçÈÝ; Manufacturer: Kemet; pro-environment: RoHS; Quality: -55~125¡æ; SN: 03.4.37.11.99D10701S; other: 100uF,10V,10%,700m¦¸; OPN: T491D107K010AT; PadsNum: 2; Category: µçÈÝ; Part: T491D107K010AT; Value: 100uF,10V; QTY: 500; Price: 2.808; OPN_JLC: OPN_JLC; SN_JLC: SN_JLC; Price_JLC: 0
footprint C_T7343-31D (îãµçÈÝ£»KEMET-DÐÍ)
pins: 1, 2

## C_T220uF/10V
designator C?, comment 220uF,10V
îãµçÈÝ; Manufacturer: AVX; pro-environment: RoHS; Quality: -55~125¡æ; SN: 03.4.37.11.99D22701S; other: 220uF,10V,10%,100m¦¸; OPN: TPSD227K010R0100; PadsNum: 2; Category: µçÈÝ; Part: TPSD227K010R0100; Value: 220uF,10V; QTY: 500; Price: 17.3862; OPN_JLC: OPN_JLC; SN_JLC: SN_JLC; Price_JLC: 0
footprint C_T7343-31D (îãµçÈÝ£»KEMET-DÐÍ)
pins: 1, 2

## C_T220uF/10V@2
designator C?, comment 220uF,10V
îãµçÈÝ; Manufacturer: AVX; pro-environment: RoHS; Quality: -55~125¡æ; SN: 03.4.37.11.99D22701S; other: 220uF,10V,10%,100m¦¸; OPN: TPSD227K010R0100; PadsNum: 2; Category: µçÈÝ; Part: TPSD227K010R0100; QTY: 500; Price: 17.3862; OPN_JLC: OPN_JLC; SN_JLC: SN_JLC; Price_JLC: 0; Value: 220uF,10V
footprint C_T7343-31D (îãµçÈÝ£»KEMET-DÐÍ)
pins: 1, 2

## C_WYO102MCMCF0KR
designator C?, comment 1nF,250VAC
X1Y2µçÈÝ,1nF/250VAC; Manufacturer: Vishay; pro-environment: RoHS; Quality: -40~125¡æ; SN: 03.4.37.18.99010201S; other: 1000pF,250VAC,20%; OPN: WYO102MCMCF0KR; PadsNum: 2; Category: µçÈÝ; Part: WYO102MCMCF0KR; Value: 1nF,250VAC; QTY: 1000; Price: ?; OPN_JLC: OPN_JLC; SN_JLC: SN_JLC; Price_JLC: 0
footprint WYO_102 (Radial Cap, Thru-Hole; 2 Leads; 0.3 in Pin Spacing)
pins: 1, 2

## C_WYO222MCMCF0KR
designator C?, comment 2.2nF,250VAC
X1Y2µçÈÝ,2.2nF/250VAC; Manufacturer: Vishay; pro-environment: RoHS; Quality: -40~125¡æ; SN: 03.4.37.18.99022201S; other: 2200pF,250VAC,20%; OPN: WYO222MCMCF0KR; PadsNum: 2; Category: µçÈÝ; Part: WYO222MCMCF0KR; Value: 2.2nF,250VAC; QTY: 2000; Price: -; OPN_JLC: OPN_JLC; SN_JLC: SN_JLC; Price_JLC: 0
footprint WYO_222 (Vishay WYOÏµÁÐYµçÈÝ)
pins: 1, 2

## C_WYO472MCMCF0KR
designator C?, comment 4.7nF,250VAC
X1Y2µçÈÝ,4.7nF/250VAC; Manufacturer: Vishay; pro-environment: RoHS; Quality: -40~125¡æ; SN: 03.4.37.18.11047201S; other: 4.7nF,250VAC,20%; OPN: WYO472MCMCF0KR; PadsNum: 2; Category: µçÈÝ; Part: WYO472MCMCF0KR; Value: 4.7nF,250VAC; QTY: 1000; Price: ?; OPN_JLC: OPN_JLC; SN_JLC: SN_JLC; Price_JLC: 0
footprint WYO_472 (Vishay WYOÏµÁÐYµçÈÝ)
pins: 1, 2

## D_1N4148WS_R1_00001
designator D?, comment 1N4148
¶þ¼«¹Ü; 100V; 0.3A; Manufacturer: Panjit; pro-environment: RoHS; Quality: -55~150¡æ; Value: 0.3A,100V; OPN: 1N4148WS_R1_00001; other: Trr=4ns; PadsNum: 2; SN: SN; Category: ¶þ¼«¹Ü; Part: 1N4148; QTY: 3000; Price: 0.1695; OPN_JLC: 1N4148WS T4; SN_JLC: C2128; Price_JLC: 0.084015
footprint SOD323 (SOD-323/SC-76; 2 Leads; Body 1.7 x 1.3 mm, (LxW))
pins: 1 A, 2 K

## D_1N4937G
designator D?, comment 1N4937
¶þ¼«¹Ü; ¿ì»Ö; 1A; 600V; 1.2V; 300ns; Manufacturer: ON; pro-environment: RoHS; Quality: -65~150¡æ; Value: 1A,600V; OPN: 1N4937G; other: Vf=1V; PadsNum: 0; SN: SN; Category: ¶þ¼«¹Ü; Part: 1N4937; QTY: 3000; Price: 0.26894; OPN_JLC: 1N4937G; SN_JLC: C152300; Price_JLC: 0.19611
footprint DO-41B (Diode, Axial; Body 5.2 x 2.7 mm (LxDia. max), Lead Dia. 0.86 mm (max))
pins: 1 A, 2 K

## D_1SS355TE-17
designator D?, comment 1SS355TE-17
¶þ¼«¹Ü; ¿ª¹Ø; 0.1A; 80V; 1.2V; 4ns; Manufacturer: RHOM; pro-environment: RoHS; Quality: -55~150¡æ; Value: 0.1A,80V; PadsNum: 2; SN: SN; Category: ¶þ¼«¹Ü; OPN: 1SS355TE-17; Part: 1SS355TE-17; QTY: 3000; Price: 0.23049; OPN_JLC: 1SS355TE-17; SN_JLC: C122634; Price_JLC: 0.103256
footprint SOD323 (SOD-323/SC-76; 2 Leads; Body 1.7 x 1.3 mm, (LxW))
pins: 1 A, 2 K

## D_B240A-E3/61T
designator D?, comment B240A
¶þ¼«¹Ü; Ð¤ÌØ»ù; 2A; 40V; 0.55; 10ns; Manufacturer: Vishay; pro-environment: RoHS; Quality: -55~150¡æ; Value: 2A,40V; OPN: B240A-E3/61T; PadsNum: 2; SN: SN; Category: ¶þ¼«¹Ü; Part: B240A; QTY: 1800; Price: 0.74919; OPN_JLC: B240A-E3/61T; SN_JLC: C280289; Price_JLC: 0.528283
footprint SMA (DO-214-AC/SMA)
pins: 1 A, 2 K

## D_BAR6305E6327HTSA1
designator D?, comment BAR63-05
¶þ¼«¹Ü; ¿ª¹Ø; 0.1A; 50V; 1.2V; Manufacturer: Infineon; Quality: -55~125¡æ; Value: 0.1A,50V; pro-environment: RoHS; OPN: BAR6305E6327HTSA1; PadsNum: 3; SN: SN; Category: ¶þ¼«¹Ü; Part: BAR63-05; QTY: 3000; Price: ?; OPN_JLC: OPN_JLC; SN_JLC: SN_JLC; Price_JLC: 0
footprint SOT23-3 (SOT-23; 3 Leads; Body 3.0 x 2.5 mm, inc. leads (LxW max))
pins: 1, 2, 3

## D_BAS16,215
designator D?, comment BAS16
¶þ¼«¹Ü; ¿ª¹Ø; 0.125A; 100V; 1.2V; 4ns; Manufacturer: Nexperia; pro-environment: RoHS; Quality: -55~150¡æ; Value: 0.215A,100V; OPN: BAS16,215; PadsNum: 3; SN: SN; Category: ¶þ¼«¹Ü; Part: BAS16; QTY: 3000; Price: 0.20826; OPN_JLC: BAS16,215; SN_JLC: C79997; Price_JLC: 0.05714
footprint SOT23-3 (SOT-23; 3 Leads; Body 3.0 x 2.5 mm, inc. leads (LxW max))
pins: 1 A, 3 K

## D_BAS21,215
designator D?, comment BAS21
¶þ¼«¹Ü; ¿ª¹Ø; 0.2A; 250V; 1.25V; 4ns; Manufacturer: Nexperia; pro-environment: RoHS; Quality: -65~150¡æ; Value: 0.2A,250V; OPN: BAS21,215; PadsNum: 2; SN: SN; Category: ¶þ¼«¹Ü; Part: BAS21; QTY: 3000; Price: 0.1469; OPN_JLC: BAS21,215; SN_JLC: C8661; Price_JLC: 0.0662
footprint SOT23-3 (SOT-23; 3 Leads; Body 3.0 x 2.5 mm, inc. leads (LxW max))
pins: 1 A, 3 K

## D_BAS28WH6327XTSA1
designator D?, comment BAS28W
¶þ¼«¹Ü; ¿ª¹Ø; 0.2A; 80V; 1.2V; 4ns; Manufacturer: Infineon; Quality: -55~150¡æ; Value: 200mA,80V; pro-environment: RoHS; OPN: BAS28WH6327XTSA1; PadsNum: 0; SN: SN; Category: ¶þ¼«¹Ü; Part: BAS28W; QTY: 3000; Price: ?; OPN_JLC: BAS28,215; SN_JLC: C182938; Price_JLC: 0.267923
footprint SOT343-3 (SOT-343; 4 Leads; Body 2.2 x 2.2 mm, inc. leads (LxW max))
pins: 1, 2, 3, 4

## D_BAS116E6327HTSA1
designator D?, comment BAS116
¶þ¼«¹Ü; ¿ª¹Ø; 0.25A; 85V; 1.2V; 600ns; Manufacturer: Infineon; pro-environment: RoHS; Quality: -55~150¡æ; Value: 0.25A,85V; OPN: BAS116E6327HTSA1; PadsNum: 0; SN: SN; Category: ¶þ¼«¹Ü; Part: BAS116; QTY: 3000; Price: 0.23956; OPN_JLC: OPN_JLC; SN_JLC: SN_JLC; Price_JLC: 0
footprint SOT23-3 (SOT-23; 3 Leads; Body 3.0 x 2.5 mm, inc. leads (LxW max))
pins: 1 A, 3 K

## D_BAT15-04R
designator D?, comment BAT15-04
¿ª¹Ø¶þ¼«¹Ü; 0.11A; 4V; 0.25V; Manufacturer: Infineon; pro-environment: RoHS; Quality: -55~150¡æ; Value: 110mA,4V; OPN: BAT15-04R; PadsNum: 3; others: Mark=4R; SN: SN; Category: ¶þ¼«¹Ü; Part: BAT15-04; QTY: 3000; Price: 1.38; OPN_JLC: BAT15-04R; SN_JLC: C16685; Price_JLC: 1.38
footprint SOT23-3 (SOT-23; 3 Leads; Body 3.0 x 2.5 mm, inc. leads (LxW max))
pins: 1, 2, 3

## D_BAT54A
designator D?, comment BAT54A
¶þ¼«¹Ü; ¿ª¹Ø; ¹²Ñô; 0.2A; 30V; 0.8V; 5ns; Manufacturer: Fairchild; pro-environment: RoHS; Quality: -55~150¡æ; Value: 0.2A,30V; other: Mark=L42; PadsNum: 3; SN: SN; Category: ¶þ¼«¹Ü; OPN: BAT54A; Part: BAT54A; QTY: 3000; Price: 0.24219; OPN_JLC: BAT54A,215; SN_JLC: C130910; Price_JLC: 0.058818
footprint SOT23-3 (SOT-23; 3 Leads; Body 3.0 x 2.5 mm, inc. leads (LxW max))
pins: 1, 2, 3

## D_BAT54C
designator D?, comment BAT54C
¶þ¼«¹Ü; ¿ª¹Ø; ¹²Òõ; 0.2A; 30V; 0.8V; 5ns; Manufacturer: Fairchild; pro-environment: RoHS; Quality: -55~150¡æ; Value: 0.2A,30V; other: MARK=L43; PadsNum: 3; SN: SN; Category: ¶þ¼«¹Ü; OPN: BAT54C; Part: BAT54C; QTY: 3000; Price: 0.23049; OPN_JLC: BAT54C,215; SN_JLC: C37704; Price_JLC: 0.056514
footprint SOT23-3 (SOT-23; 3 Leads; Body 3.0 x 2.5 mm, inc. leads (LxW max))
pins: 1, 2, 3

## D_BAT54S
designator D?, comment BAT54S
¶þ¼«¹Ü; ¿ª¹Ø; ´®Áª; 0.2A; 30V; 0.8V; 5ns; Manufacturer: Fairchild; pro-environment: RoHS; Quality: -55~150¡æ; Value: 0.2A,30V; other: ÕýÏòÑ¹½µ=0.4V;»Ö¸´Ê±¼ä=5ns;MARK=L44; PadsNum: 3; SN: SN; Category: ¶þ¼«¹Ü; OPN: BAT54S; Part: BAT54S; QTY: 3000; Price: 0.23985; OPN_JLC: BAT54S,215; SN_JLC: C47546; Price_JLC: 0.053191
footprint SOT23-3 (SOT-23; 3 Leads; Body 3.0 x 2.5 mm, inc. leads (LxW max))
pins: 1, 2, 3

## D_BAT54XV2
designator D?, comment BAT54XV2T1H
30V, 200mA Schottky Barrier Diode; Manufacturer: Onsemi; pro-environment: RoHS; Quality: -55~125°C; Value: 0.2A, 30V; other: Trr=4ns; PadsNum: 2; SN: SN; Category: Schottky Diodes & Rectifiers; OPN: BAT54XV2T1H; Part: BAT54XV2T1H; QTY: 3000
footprint SOD523 (SOD-523; 2 Leads; Body 1.2x 0.8 mm, (LxW))
pins: 1 K, 2 A

## D_BAT1503WE6327
designator D?, comment BAT1503W
¿ª¹Ø¶þ¼«¹Ü; 0.11A; 4V; 0.25V; Manufacturer: Fairchild; pro-environment: RoHS; Quality: -55~150¡æ; Value: 110mA,4V; OPN: BAT1503WE6327; PadsNum: 0; SN: SN; Category: ¶þ¼«¹Ü; Part: BAT1503W; QTY: 3000; Price: 1.05316; OPN_JLC: OPN_JLC; SN_JLC: SN_JLC; Price_JLC: 0
footprint SOD323 (SOD-323/SC-76; 2 Leads; Body 1.7 x 1.3 mm, (LxW))
pins: 1 A, 2 K

## D_BAV99LT1G
designator D?, comment BAV99L
¿ª¹Ø¶þ¼«¹Ü;2¹Ü´®Áª; Manufacturer: Infineon; pro-environment: RoHS; Quality: -65~150¡æ; SN: 03.4.21.14.48AV9901S; Value: 0.7A,70V; OPN: BAV99LT1G; other: ÕýÏòÑ¹½µ=1.25V;»Ö¸´Ê±¼ä=6ns; PadsNum: 0; Category: ¶þ¼«¹Ü; Part: BAV99L; QTY: 3000; Price: ?; OPN_JLC: BAV99 A7W; SN_JLC: C2500; Price_JLC: 0
footprint SOT23-3 (SOT-23; 3 Leads; Body 3.0 x 2.5 mm, inc. leads (LxW max))
pins: 1, 2, 3

## D_CMPD4448 TR
designator D?, comment CMPD4448
Í¨ÓÃ¿ª¹Ø¶þ¼«¹Ü; Manufacturer: Central Semiconductor; pro-environment: RoHS; Quality: -65~150¡æ; Value: 0.25A,100V; OPN: CMPD4448 TR; other: MARK=AAD; PadsNum: 0; SN: SN; Category: ¶þ¼«¹Ü; Part: CMPD4448; QTY: 3000; Price: ?; OPN_JLC: OPN_JLC; SN_JLC: SN_JLC; Price_JLC: 0
footprint SOT23-3 (SOT-23; 3 Leads; Body 3.0 x 2.5 mm, inc. leads (LxW max))
pins: 1 A, 3 K

## D_CMSH5-60 TR13
designator D?, comment CMSH5-60
Ð¤ÌØ»ù¶þ¼«¹Ü; 5A; 60V; 0.62V@5A; Manufacturer: Diodes; pro-environment: RoHS; Quality: -65~150¡æ; Value: 5A,60V; OPN: CMSH5-60 TR13; other: MARK=CS560; PadsNum: 0; SN: SN; Category: ¶þ¼«¹Ü; Part: CMSH5-60; QTY: 3000; Price: 3.0069; OPN_JLC: OPN_JLC; SN_JLC: SN_JLC; Price_JLC: 0
footprint SMC (DO-214-AB/SMC)
pins: 1 A, 2 K

## D_CUS10S30,H3F
designator D?, comment CUS10S30
Ð¤ÌØ»ù¶þ¼«¹Ü; 1A; 20V; 0.23V@0.1A; Manufacturer: TOSHIBA; pro-environment: RoHS; Quality: -55~170¡æ; Value: 1A,20V; OPN: CUS10S30,H3F; other: MARK=8C; PadsNum: 2; SN: SN; Category: ¶þ¼«¹Ü; Part: CUS10S30; QTY: 3000; Price: 0.147456; OPN_JLC: CUS10S30,H3F; SN_JLC: C146335; Price_JLC: 0.147456
footprint SOD323 (SOD-323/SC-76; 2 Leads; Body 1.7 x 1.3 mm, (LxW))
pins: 1 A, 2 K

## D_DFLS1100Q-7
designator D?, comment DFLS1100
Ð¤ÌØ»ù¶þ¼«¹Ü; Manufacturer: Diodes; pro-environment: RoHS; Quality: -55~170¡æ; SN: 03.4.21.17.99DFLS01S; Value: 1A,100V; OPN: DFLS1100Q-7; other: MARK=F09; PadsNum: 0; Category: ¶þ¼«¹Ü; Part: DFLS1100; QTY: 3000; Price: 1.11618; OPN_JLC: OPN_JLC; SN_JLC: SN_JLC; Price_JLC: 0
footprint POWERDI_123 (DIODEÖ®Ð¤ÍÑ»ù¶þ¼«¹Ü)
pins: 1 A, 2 K

## D_ES3G-E3/57T
designator D?, comment ES3G-E3/57T
¿ì»Ö¶þ¼«¹Ü,3A,400V; Manufacturer: Vishay; pro-environment: RoHS; Quality: -55~150¡æ; SN: 03.4.21.11.99ES3G01S; other: Vf=1.1V; PadsNum: 0; Value: 3A,400V; Category: ¶þ¼«¹Ü; OPN: ES3G-E3/57T; Part: ES3G-E3/57T; QTY: 850; Price: 1.5093; OPN_JLC: OPN_JLC; SN_JLC: SN_JLC; Price_JLC: 0
footprint SMC (DO-214-AB/SMC)
pins: 1 A, 2 K